# Altium footprint library 7-Connectors-12.PcbLib: 76 footprints (part 1 of 5)
Each footprint in its own frame and in the unit in brackets; x right, y up, seen from the top. Pads: shape width x height; smd on the part's side, far side on the other; paste and mask are expansions set on the pad; w line width, h text height; cw(c..) or ccw(c..) is an arc to the next point about the centre after c.
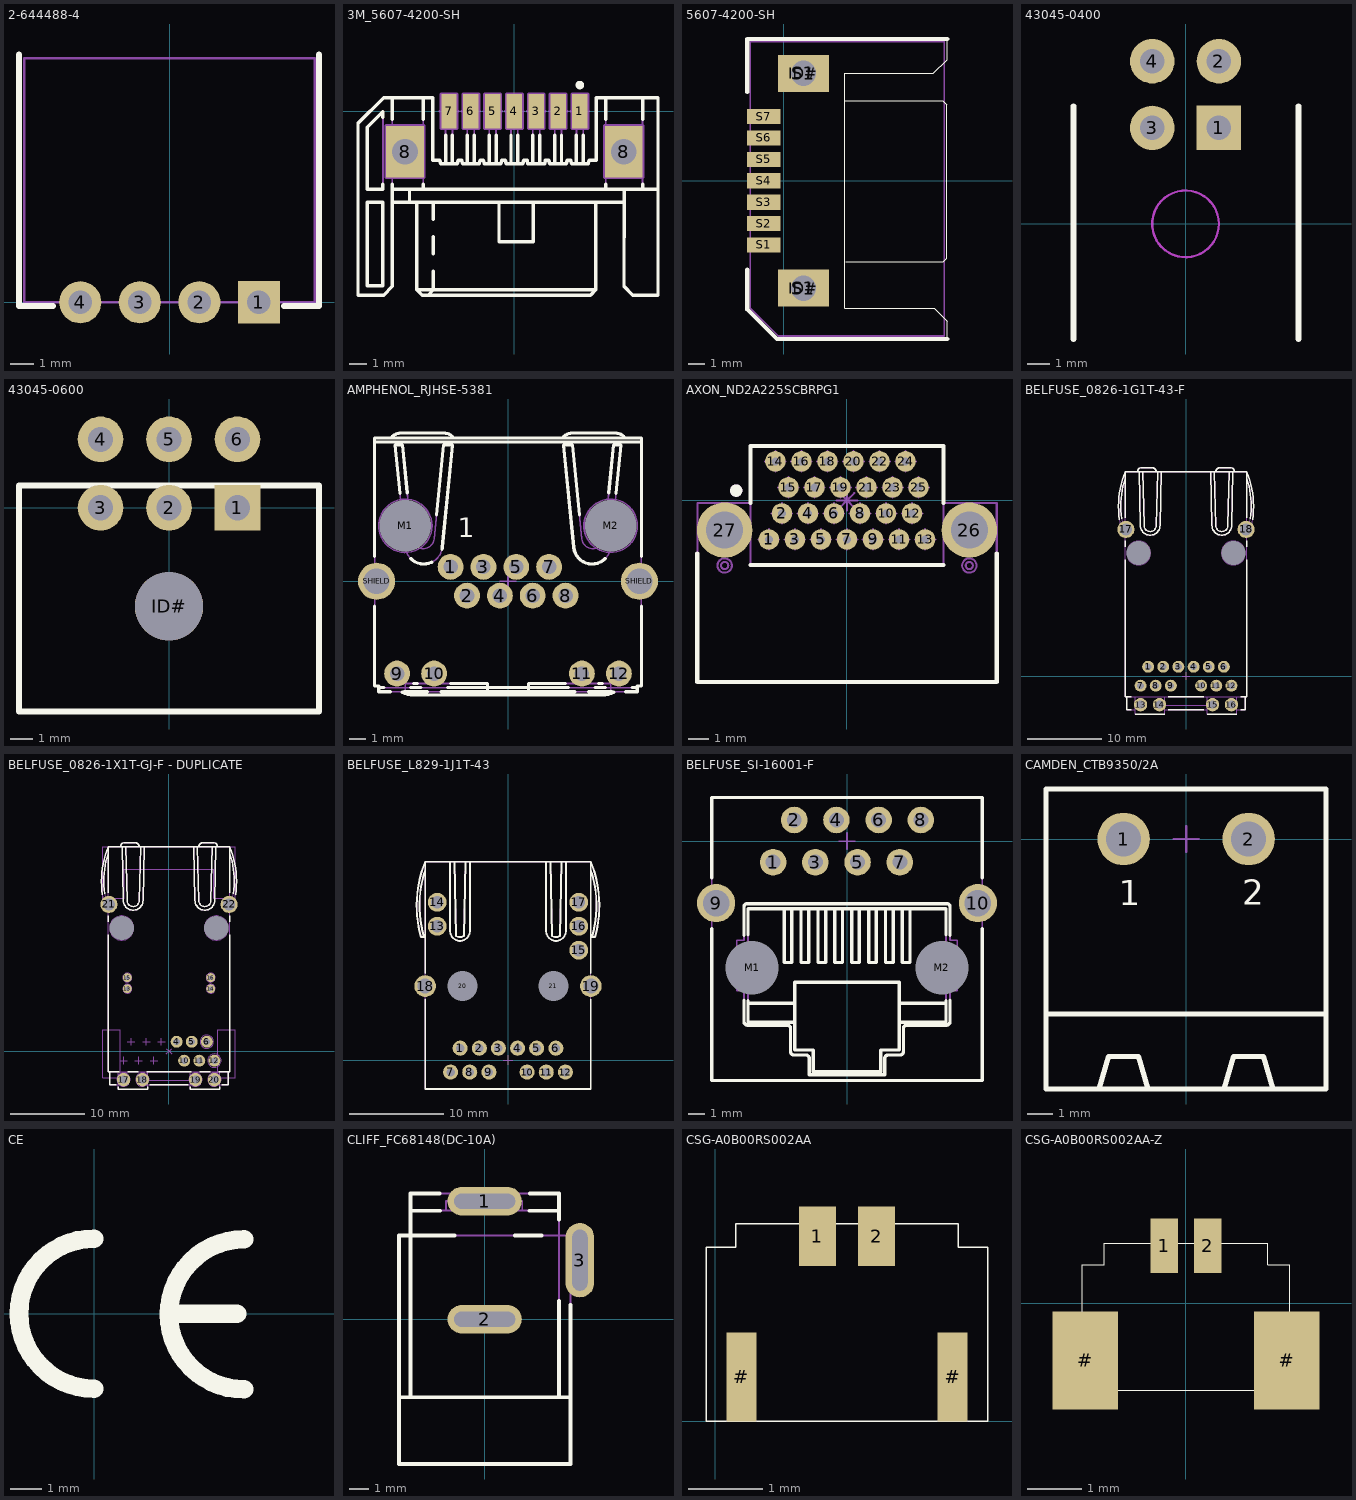
[diagram p0: the footprints below, top view; thin cyan lines are the x and y axes]

## 2-644488-4 [mm] "797-3097 // TE Connectivity"
height 26
pads (4):
  rect 1.8x1.8 hole 1 mask+0.07: 1(3.81,0)
  round 1.8 hole 1 mask+0.07: 2(1.27,0) 3(-1.27,0)
  round 1.8 hole 1: 4(-3.81,0)
Top Overlay:
  lines w0.254: -6.426,10.566 -6.426,-0.165 -4.978,-0.165 ; 4.889,-0.152 6.375,-0.152 6.375,10.566
Mechanical 15:
  lines w0.1: -6.2,0 -6.2,10.414 6.2,10.414 6.2,0 -6.2,0
3D body "mta-100_2_54.stp": height 8, standoff -2, extent -6.188,-0.266 6.162,10.541
3D body "2-2_1_5.stp": height 0.1, standoff -2.1, extent -4.81,-1 -2.81,1
3D body "2-2_1_5.stp": height 0.1, standoff -2.1, extent -2.27,-1 -0.27,1
3D body "2-2_1_5.stp": height 0.1, standoff -2.1, extent 0.27,-1 2.27,1
3D body "2-2_1_5.stp": height 0.1, standoff -2.1, extent 2.81,-1 4.81,1

## 3M_5607-4200-SH [mm] "1.27mm (.050\") Pitch, Surface Mount, Right Angle, Serial ATA Plug (SATA)"
height 4
pads (9):
  rect 0.9x2 smd: 1(3.81,0) 2(2.54,0) 3(1.27,0) 4(0,0) 5(-1.27,0) 6(-2.54,0) 7(-3.81,0)
  rect 2.2x3 hole 1.5: 8(-6.37,-2.36) 8(6.37,-2.36)
Top Overlay:
  circle w0.25: c3.81,1.516 r0.125
  lines w0.2: -7.66,-4.25 -7.66,-4.559 -8.56,-4.559 -8.56,-0.937 -7.66,-0.037 -7.66,-0.346 ; -7.11,-5.309 6.38,-5.309 ; -7.11,-4.559 8.36,-4.559 ; -7.11,-4.26 -7.11,-10.209 -7.61,-10.709 -9.11,-10.709 -9.11,-0.709 -7.61,0.791 -4.76,0.791 -4.76,-2.859 -4.345,-2.859 -4.296,-3.059 -3.324,-3.059 -3.275,-2.859 -3.075,-2.859 -3.026,-3.059 -2.054,-3.059 -2.005,-2.859 -1.805,-2.859 -1.756,-3.059 -0.784,-3.059 -0.735,-2.859 -0.535,-2.859 -0.486,-3.059 0.486,-3.059 0.535,-2.859 0.735,-2.859 0.784,-3.059 1.756,-3.059 1.805,-2.859 2.005,-2.859 2.054,-3.059 3.026,-3.059 3.075,-2.859 3.275,-2.859 3.324,-3.059 4.296,-3.059 4.345,-2.859 4.76,-2.859 4.76,0.791 8.36,0.791 8.36,-10.709 6.88,-10.709 6.38,-10.209 6.382,-4.569 ; -7.11,-0.46 -7.11,0.791 ; -6.11,-5.309 -6.11,-4.559 ; -5.68,-5.309 -5.68,-10.409 ; -5.31,-4.559 -5.31,-4.26 ; -5.31,-0.46 -5.31,0.791 ; -5.019,-10.709 -4.719,-10.409 -4.719,-9.309 ; -4.719,-8.309 -4.719,-7.309 ; -4.719,-6.309 -4.719,-5.309 ; -4.01,-3.059 -4.01,-1.4 ; -3.61,-3.059 -3.61,-1.4 ; -2.74,-3.059 -2.74,-1.4 ; -2.34,-3.059 -2.34,-1.4 ; -1.47,-3.059 -1.47,-1.4 ; -1.07,-3.059 -1.07,-1.4 ; -0.9,-5.309 -0.9,-7.609 1.1,-7.609 1.1,-5.309 ; -0.2,-3.059 -0.2,-1.4 ; 0.2,-3.059 0.2,-1.4 ; 1.07,-3.059 1.07,-1.4 ; 1.47,-3.059 1.47,-1.4 ; 2.34,-3.059 2.34,-1.4 ; 2.74,-3.059 2.74,-1.4 ; 3.61,-3.059 3.61,-1.4 ; 4.01,-3.059 4.01,-1.4 ; 4.73,-5.309 4.73,-10.409 ; 5.31,-4.559 5.31,-4.26 ; 5.31,-0.46 5.31,0.791 ; 7.46,-4.559 7.46,-4.26 ; 7.46,-0.46 7.46,0.791 ; -5.68,-10.409 -5.38,-10.709 4.43,-10.709 4.73,-10.409 ; -5.68,-10.409 4.73,-10.409 ; -8.56,-10.159 -7.66,-10.159 -7.66,-5.309 -8.56,-5.309 -8.56,-10.159
Mechanical 8:
  circle w0.1: c-6.37,-2.36 r0.75
  circle w0.1: c6.37,-2.36 r0.75
  lines w0.2: -6.87,-2.36 -6.37,-2.36 ; -6.37,-2.86 -6.37,-2.36 ; -6.37,-1.86 -6.37,-2.36 ; -5.87,-2.36 -6.37,-2.36 ; -4.31,0 -3.81,0 ; -3.81,-0.5 -3.81,0 ; -3.81,0.5 -3.81,0 ; -3.31,0 -3.81,0 ; -3.04,0 -2.54,0 ; -2.54,-0.5 -2.54,0 ; -2.54,0.5 -2.54,0 ; -2.04,0 -2.54,0 ; -1.77,0 -1.27,0 ; -1.27,-0.5 -1.27,0 ; -1.27,0.5 -1.27,0 ; -0.77,0 -1.27,0 ; -0.5,0 0,0 ; 0,-0.5 0,0 ; 0,0.5 0,0 ; 0.5,0 0,0 ; 0.77,0 1.27,0 ; 1.27,-0.5 1.27,0 ; 1.27,0.5 1.27,0 ; 1.77,0 1.27,0 ; 2.04,0 2.54,0 ; 2.54,-0.5 2.54,0 ; 2.54,0.5 2.54,0 ; 3.04,0 2.54,0 ; 3.31,0 3.81,0 ; 3.81,-0.5 3.81,0 ; 3.81,0.5 3.81,0 ; 4.31,0 3.81,0 ; 5.87,-2.36 6.37,-2.36 ; 6.37,-2.86 6.37,-2.36 ; 6.37,-1.86 6.37,-2.36 ; 6.87,-2.36 6.37,-2.36 ; -7.47,-3.86 -7.47,-0.86 -5.27,-0.86 -5.27,-3.86 -7.47,-3.86 ; -4.26,-1 -4.26,1 -3.36,1 -3.36,-1 -4.26,-1 ; -2.99,-1 -2.99,1 -2.09,1 -2.09,-1 -2.99,-1 ; -1.72,-1 -1.72,1 -0.82,1 -0.82,-1 -1.72,-1 ; -0.45,-1 -0.45,1 0.45,1 0.45,-1 -0.45,-1 ; 0.82,-1 0.82,1 1.72,1 1.72,-1 0.82,-1 ; 2.09,-1 2.09,1 2.99,1 2.99,-1 2.09,-1 ; 3.36,-1 3.36,1 4.26,1 4.26,-1 3.36,-1 ; 5.27,-3.86 5.27,-0.86 7.47,-0.86 7.47,-3.86 5.27,-3.86
Mechanical 14:
  lines w0.1: -7.11,-5.309 6.38,-5.309 ; -7.11,-4.559 8.36,-4.559 ; -7.11,0.791 -7.11,-10.209 -7.61,-10.709 -9.11,-10.709 -9.11,-0.709 -7.61,0.791 -4.76,0.791 -4.76,-2.859 -4.345,-2.859 -4.296,-3.059 -3.324,-3.059 -3.275,-2.859 -3.075,-2.859 -3.026,-3.059 -2.054,-3.059 -2.005,-2.859 -1.805,-2.859 -1.756,-3.059 -0.784,-3.059 -0.735,-2.859 -0.535,-2.859 -0.486,-3.059 0.486,-3.059 0.535,-2.859 0.735,-2.859 0.784,-3.059 1.756,-3.059 1.805,-2.859 2.005,-2.859 2.054,-3.059 3.026,-3.059 3.075,-2.859 3.275,-2.859 3.324,-3.059 4.296,-3.059 4.345,-2.859 4.76,-2.859 4.76,0.791 8.36,0.791 8.36,-10.709 6.88,-10.709 6.38,-10.209 6.382,-4.569 ; -6.11,-5.309 -6.11,-4.559 ; -5.68,-5.309 -5.68,-10.409 ; -5.31,-4.559 -5.31,0.791 ; -5.019,-10.709 -4.719,-10.409 -4.719,-9.309 ; -4.719,-8.309 -4.719,-7.309 ; -4.719,-6.309 -4.719,-5.309 ; -4.01,-3.059 -4.01,0.591 -3.61,0.591 -3.61,-3.059 ; -2.74,-3.059 -2.74,0.591 -2.34,0.591 -2.34,-3.059 ; -1.47,-3.059 -1.47,0.591 -1.07,0.591 -1.07,-3.059 ; -0.9,-5.309 -0.9,-7.609 1.1,-7.609 1.1,-5.309 ; -0.2,-3.059 -0.2,0.591 0.2,0.591 0.2,-3.059 ; 1.07,-3.059 1.07,0.591 1.47,0.591 1.47,-3.059 ; 2.34,-3.059 2.34,0.591 2.74,0.591 2.74,-3.059 ; 3.61,-3.059 3.61,0.591 4.01,0.591 4.01,-3.059 ; 4.73,-5.309 4.73,-10.409 ; 5.31,-4.559 5.31,0.791 ; 7.46,-4.559 7.46,0.791 ; -5.68,-10.409 -5.38,-10.709 4.43,-10.709 4.73,-10.409 ; -5.68,-10.409 4.73,-10.409 ; -8.56,-10.159 -7.66,-10.159 -7.66,-5.309 -8.56,-5.309 -8.56,-10.159 ; -8.56,-4.559 -7.66,-4.559 -7.66,-0.037 -8.56,-0.937 -8.56,-4.559 ; -6.52,-3.535 -6.22,-3.535 -6.22,-1.177 -6.52,-1.177 -6.52,-3.535 ; 6.22,-3.535 6.52,-3.535 6.52,-1.177 6.22,-1.177 6.22,-3.535
3D body "3M_5607-4200-SH.stp": height 4, standoff -2.7, extent -9.11,-10.709 8.36,0.791

## 5607-4200-SH [mm] "828-2055 // 3M"
height 6.72
pads (11):
  round 2.2 hole 1.5: ID#(1.18,-6.37)
  round 2.2 hole 1.5 mask+0.07: ID#(1.18,6.37)
  rect 2x0.9 smd mask+0.07: S1(-1.18,-3.81) S2(-1.18,-2.54) S3(-1.18,-1.27) S4(-1.18,0) S5(-1.18,1.27) S6(-1.18,2.54) S7(-1.18,3.81)
  rect 3x2.2 smd mask+0.07: S1(1.18,-6.37) S1(1.18,6.37)
Top Overlay:
  lines w0.03: 3.658,4.75 9.449,4.75 9.677,4.521 9.677,-4.597 9.474,-4.801 3.683,-4.801 ; 9.703,-9.385 9.703,-8.331 8.941,-7.569 3.632,-7.569 3.632,6.363 8.89,6.363 9.703,7.175 9.703,8.407
  lines w0.254: -2.146,-5.271 -2.146,-7.633 -0.394,-9.385 9.703,-9.385 ; -2.146,5.258 -2.146,8.407 9.703,8.407
Mechanical 15:
  lines w0.1: -1.969,-7.556 -0.318,-9.207 9.525,-9.207 9.525,8.255 -1.969,8.255 -1.969,-7.556
3D body "3m5561_sata.stp": height 4, standoff -2.7, extent -1.991,-8.735 9.509,8.735
3D body "0_9-2.stp": height 0.02, standoff 0, extent -2.18,3.36 -0.18,4.26
3D body "0_9-2.stp": height 0.02, standoff 0, extent -2.18,2.09 -0.18,2.99
3D body "0_9-2.stp": height 0.02, standoff 0, extent -2.18,0.82 -0.18,1.72
3D body "0_9-2.stp": height 0.02, standoff 0, extent -2.18,-0.45 -0.18,0.45
3D body "0_9-2.stp": height 0.02, standoff 0, extent -2.18,-1.72 -0.18,-0.82
3D body "0_9-2.stp": height 0.02, standoff 0, extent -2.18,-2.99 -0.18,-2.09
3D body "0_9-2.stp": height 0.02, standoff 0, extent -2.18,-4.26 -0.18,-3.36

## 43045-0400 [mm] "233-2955 // Molex"
height 9.6
pads (4):
  rect 2x2 hole 1.1 mask+0.07: 1(1.5,4.318)
  round 2 hole 1.1 mask+0.07: 2(1.5,7.318) 3(-1.5,4.318)
  round 2 hole 1.1: 4(-1.5,7.318)
Top Overlay:
  lines w0.254: -5.042,-5.182 -5.042,5.298 ; 5.08,-5.182 5.08,5.298
Keep-Out Layer:
  circle w0.1: c0,-0.002 r1.5
Mechanical 1:
  circle w0.1: c0,-0.002 r1.5
3D body "43045-0400.stp": height 8.67, standoff -3.18, extent -4.825,-4.98 4.825,7.55
3D body "2-2_1_5.stp": height 0.1, standoff -2.1, extent -2.5,6.318 -0.5,8.318
3D body "2-2_1_5.stp": height 0.1, standoff -2.1, extent 0.5,6.318 2.5,8.318
3D body "2-2_1_5.stp": height 0.1, standoff -2.1, extent 0.5,3.318 2.5,5.318
3D body "2-2_1_5.stp": height 0.1, standoff -2.1, extent -2.5,3.318 -0.5,5.318

## 43045-0600 [mm] "Molex"
height 7.37
pads (7):
  rect 2x2 hole 1.1: 1(3,0)
  round 2 hole 1.1 mask+0.07: 2(0,0) 3(-3,0) 4(-3,3) 5(0,3) 6(3,3)
  round 3 hole 3 mask+0.07: ID#(0,-4.32)
Top Overlay:
  lines w0.254: -6.575,-8.93 6.575,-8.93 6.575,0.98 -6.575,0.98 -6.575,-8.93
3D body "43045-0400.stp": height 8.67, standoff -3.18, extent -4.8,-9.121 4.85,3.409

## AMPHENOL_RJHSE-5381 [mm] "1 Port, 8 Positions, CAT5 RJ45 Modular Connector With Yellow And Green LEDs"
height 13.46
pads (16):
  round 1.6 hole 0.9: 1(-3.554,0.886) 2(-2.538,-0.894) 3(-1.522,0.886) 4(-0.506,-0.894) 5(0.51,0.886) 6(1.526,-0.894) 7(2.542,0.886) 8(3.558,-0.894) 9(-6.862,-5.714) 10(-4.572,-5.714) 11(4.568,-5.714) 12(6.858,-5.714)
  round 1 hole 3.2 unplated mask+1.1: M1(-6.352,3.426) M2(6.348,3.426)
  round 2.3 hole 1.6: SHIELD(-8.132,-0.004) SHIELD(8.128,-0.004)
Top Overlay:
  lines w0.2: -8.257,-1.549 -8.257,-6.478 -8.003,-6.478 -8.003,-6.834 -7.293,-6.834 ; -8.257,1.541 -8.257,8.863 8.253,8.863 8.253,1.541 ; -8.257,8.609 8.253,8.609 ; -8.003,-6.58 -7.693,-6.58 ; -7.242,8.863 cw(c-6.621,8.379) -6.621,9.166 -3.979,9.166 cw(c-3.979,8.379) -3.358,8.863 ; -6.688,5.449 -6.987,8.432 -6.53,8.432 -6.233,5.473 ; -6.54,-6.87 ccw(c-5.844,-5.507) -5.844,-7.037 5.84,-7.037 ccw(c5.84,-5.507) 6.536,-6.87 ; -6.431,-6.834 -5.003,-6.834 ; -6.031,-6.58 -5.403,-6.58 ; -6.022,1.403 ccw(c-5.209,2.214) -4.719,1.176 ; -5.83,-6.326 -5.604,-6.326 ; -4.422,4.118 -3.99,8.432 -3.431,8.432 -4.066,2.1 cw(c-5.209,2.214) -4.089,1.961 ; -4.141,-6.834 4.137,-6.834 ; -3.741,-6.58 3.737,-6.58 ; -3.54,-6.326 -1.272,-6.326 -1.272,-6.834 ; 1.268,-6.834 1.268,-6.326 3.536,-6.326 ; 3.366,8.863 cw(c3.986,8.379) 3.986,9.166 6.628,9.166 cw(c6.628,8.379) 7.249,8.863 ; 4.418,4.118 3.986,8.432 3.427,8.432 4.062,2.1 ccw(c5.205,2.214) 6.018,1.403 ; 4.999,-6.834 6.427,-6.834 ; 5.399,-6.58 6.027,-6.58 ; 5.6,-6.326 5.826,-6.326 ; 6.229,5.473 6.526,8.432 6.983,8.432 6.684,5.449 ; 7.289,-6.834 7.999,-6.834 7.999,-6.478 8.253,-6.478 8.253,-1.549 ; 7.689,-6.58 7.999,-6.58
  text "1" at -3.12,2.725 h1.2
Mechanical 8:
  circle w0.1: c6.348,3.426 r1.65
  circle w0.1: c-6.352,3.426 r1.65
  circle w0.1: c8.128,-0.004 r0.8
  circle w0.1: c-8.132,-0.004 r0.8
  circle w0.1: c3.558,-0.894 r0.45
  circle w0.1: c1.526,-0.894 r0.45
  circle w0.1: c-0.506,-0.894 r0.45
  circle w0.1: c-2.538,-0.894 r0.45
  circle w0.1: c-3.554,0.886 r0.45
  circle w0.1: c-1.522,0.886 r0.45
  circle w0.1: c0.51,0.886 r0.45
  circle w0.1: c2.542,0.886 r0.45
  lines w0.1: -8.632,-0.004 -8.132,-0.004 ; -8.132,-0.504 -8.132,-0.004 ; -8.132,0.496 -8.132,-0.004 ; -7.632,-0.004 -8.132,-0.004 ; -7.362,-5.714 -6.862,-5.714 ; -6.862,-6.214 -6.862,-5.714 ; -6.862,-5.214 -6.862,-5.714 ; -6.852,3.426 -6.352,3.426 ; -6.362,-5.714 -6.862,-5.714 ; -6.352,2.926 -6.352,3.426 ; -6.352,3.926 -6.352,3.426 ; -5.852,3.426 -6.352,3.426 ; -5.072,-5.714 -4.572,-5.714 ; -4.572,-6.214 -4.572,-5.714 ; -4.572,-5.214 -4.572,-5.714 ; -4.072,-5.714 -4.572,-5.714 ; -4.054,0.886 -3.554,0.886 ; -3.554,0.386 -3.554,0.886 ; -3.554,1.386 -3.554,0.886 ; -3.054,0.886 -3.554,0.886 ; -3.038,-0.894 -2.538,-0.894 ; -2.538,-1.394 -2.538,-0.894 ; -2.538,-0.394 -2.538,-0.894 ; -2.038,-0.894 -2.538,-0.894 ; -2.022,0.886 -1.522,0.886 ; -1.522,0.386 -1.522,0.886 ; -1.522,1.386 -1.522,0.886 ; -1.022,0.886 -1.522,0.886 ; -1.006,-0.894 -0.506,-0.894 ; -0.506,-1.394 -0.506,-0.894 ; -0.506,-0.394 -0.506,-0.894 ; -0.5,0 0,0 ; -0.006,-0.894 -0.506,-0.894 ; 0,-0.5 0,0 ; 0,0.5 0,0 ; 0.01,0.886 0.51,0.886 ; 0.5,0 0,0 ; 0.51,0.386 0.51,0.886 ; 0.51,1.386 0.51,0.886 ; 1.01,0.886 0.51,0.886 ; 1.026,-0.894 1.526,-0.894 ; 1.526,-1.394 1.526,-0.894 ; 1.526,-0.394 1.526,-0.894 ; 2.026,-0.894 1.526,-0.894 ; 2.042,0.886 2.542,0.886 ; 2.542,0.386 2.542,0.886 ; 2.542,1.386 2.542,0.886 ; 3.042,0.886 2.542,0.886 ; 3.058,-0.894 3.558,-0.894 ; 3.558,-1.394 3.558,-0.894 ; 3.558,-0.394 3.558,-0.894 ; 4.058,-0.894 3.558,-0.894 ; 4.068,-5.714 4.568,-5.714 ; 4.568,-6.214 4.568,-5.714 ; 4.568,-5.214 4.568,-5.714 ; 5.068,-5.714 4.568,-5.714 ; 5.848,3.426 6.348,3.426 ; 6.348,2.926 6.348,3.426 ; 6.348,3.926 6.348,3.426 ; 6.358,-5.714 6.858,-5.714 ; 6.848,3.426 6.348,3.426 ; 6.858,-6.214 6.858,-5.714 ; 6.858,-5.214 6.858,-5.714 ; 7.358,-5.714 6.858,-5.714 ; 7.628,-0.004 8.128,-0.004 ; 8.128,-0.504 8.128,-0.004 ; 8.128,0.496 8.128,-0.004 ; 8.628,-0.004 8.128,-0.004
Mechanical 14:
  lines w0.1: -8.257,-0.408 cw(c-7.884,-0.027) -8.257,0.354 ; -8.257,8.609 8.253,8.609 ; -8.003,-6.58 7.999,-6.58 ; -7.242,8.863 cw(c-6.621,8.379) -6.621,9.166 -3.979,9.166 cw(c-3.979,8.379) -3.358,8.863 ; -6.606,-6.834 ccw(c-5.844,-5.507) -5.844,-7.037 5.84,-7.037 ccw(c5.84,-5.507) 6.602,-6.834 ; -6.352,-6.834 -6.352,-6.326 -1.272,-6.326 -1.272,-6.834 ; 1.268,-6.834 1.268,-6.326 6.348,-6.326 6.348,-6.834 ; 3.366,8.863 cw(c3.986,8.379) 3.986,9.166 6.628,9.166 cw(c6.628,8.379) 7.249,8.863 ; 8.253,-0.408 ccw(c7.88,-0.027) 8.253,0.354 ; -8.257,-6.478 -8.003,-6.478 -8.003,-6.834 7.999,-6.834 7.999,-6.478 8.253,-6.478 8.253,8.863 -8.257,8.863 -8.257,-6.478 ; -6.987,8.432 -6.352,2.1 ccw(c-5.209,2.214) -4.066,2.1 -3.431,8.432 -3.99,8.432 -4.572,2.63 cw(c-5.26,2.697) -5.948,2.63 -6.53,8.432 -6.987,8.432 ; 3.427,8.432 4.062,2.1 ccw(c5.205,2.214) 6.348,2.1 6.983,8.432 6.526,8.432 5.944,2.63 cw(c5.256,2.697) 4.568,2.63 3.986,8.432 3.427,8.432
  text "1" at -3.12,2.725 h1.2
3D body "AMPHENOL_RJHSE-5381.stp": height 15.14, standoff -3.7, extent -8.417,-7.037 8.413,9.166

## AXON_ND2A225SCBRPG1 [mm] "AXON Nano-D 2 Row Right Angle PCB Receptacle With Threaded Hole #0-80 UNF"
height 3.82
pads (27):
  round 1 hole 0.4: 1(-3.81,-1.905) 2(-3.175,-0.635) 3(-2.54,-1.905) 4(-1.905,-0.635) 5(-1.27,-1.905) 6(-0.635,-0.635) 7(0,-1.905) 8(0.635,-0.635) 9(1.27,-1.905) 10(1.905,-0.635) 11(2.54,-1.905) 12(3.175,-0.635) 13(3.81,-1.905) 14(-3.493,1.905) 15(-2.858,0.635) 16(-2.222,1.905) 17(-1.587,0.635) 18(-0.953,1.905) 19(-0.318,0.635) 20(0.318,1.905) 21(0.953,0.635) 22(1.587,1.905) 23(2.222,0.635) 24(2.858,1.905) 25(3.493,0.635)
  round 2.7 hole 1.8: 26(5.969,-1.448) 27(-5.968,-1.448)
Top Overlay:
  circle w0.3: c-5.408,0.478 r0.15
  lines w0.2: -7.304,-2.6 -7.304,-8.868 7.306,-8.868 7.306,-2.6 ; -4.704,-3.148 4.701,-3.148 ; -4.699,-0.128 -4.699,2.662 ; 4.701,-0.128 4.701,2.662 ; -4.699,2.662 4.701,2.662 ; -4.699,2.662 4.701,2.662
Mechanical 8:
  circle w0.1: c5.969,-1.448 r0.9
  circle w0.1: c-5.968,-1.448 r0.9
  lines w0.1: -6.468,-1.448 -5.968,-1.448 ; -5.968,-1.948 -5.968,-1.448 ; -5.968,-0.948 -5.968,-1.448 ; -5.468,-1.448 -5.968,-1.448 ; -4.31,-1.905 -3.81,-1.905 ; -3.993,1.905 -3.493,1.905 ; -3.81,-2.405 -3.81,-1.905 ; -3.81,-1.405 -3.81,-1.905 ; -3.675,-0.635 -3.175,-0.635 ; -3.493,1.405 -3.493,1.905 ; -3.493,2.405 -3.493,1.905 ; -3.358,0.635 -2.858,0.635 ; -3.31,-1.905 -3.81,-1.905 ; -3.175,-1.135 -3.175,-0.635 ; -3.175,-0.135 -3.175,-0.635 ; -3.04,-1.905 -2.54,-1.905 ; -2.993,1.905 -3.493,1.905 ; -2.858,0.135 -2.858,0.635 ; -2.858,1.135 -2.858,0.635 ; -2.723,1.905 -2.222,1.905 ; -2.675,-0.635 -3.175,-0.635 ; -2.54,-2.405 -2.54,-1.905 ; -2.54,-1.405 -2.54,-1.905 ; -2.405,-0.635 -1.905,-0.635 ; -2.358,0.635 -2.858,0.635 ; -2.222,1.405 -2.222,1.905 ; -2.222,2.405 -2.222,1.905 ; -2.088,0.635 -1.587,0.635 ; -2.04,-1.905 -2.54,-1.905 ; -1.905,-1.135 -1.905,-0.635 ; -1.905,-0.135 -1.905,-0.635 ; -1.77,-1.905 -1.27,-1.905 ; -1.723,1.905 -2.222,1.905 ; -1.587,0.135 -1.587,0.635 ; -1.587,1.135 -1.587,0.635 ; -1.453,1.905 -0.953,1.905 ; -1.405,-0.635 -1.905,-0.635 ; -1.27,-2.405 -1.27,-1.905 ; -1.27,-1.405 -1.27,-1.905 ; -1.135,-0.635 -0.635,-0.635 ; -1.088,0.635 -1.587,0.635 ; -0.953,1.405 -0.953,1.905 ; -0.953,2.405 -0.953,1.905 ; -0.818,0.635 -0.318,0.635 ; -0.77,-1.905 -1.27,-1.905 ; -0.635,-1.135 -0.635,-0.635 ; -0.635,-0.135 -0.635,-0.635 ; -0.5,-1.905 0,-1.905 ; -0.5,0 0,0 ; -0.453,1.905 -0.953,1.905 ; -0.354,-0.354 0,0 ; -0.354,0.354 0,0 ; -0.318,0.135 -0.318,0.635 ; -0.318,1.135 -0.318,0.635 ; -0.183,1.905 0.318,1.905 ; -0.135,-0.635 -0.635,-0.635 ; 0,-2.405 0,-1.905 ; 0,-1.405 0,-1.905 ; 0,-0.5 0,0 ; 0,0.5 0,0 ; 0.135,-0.635 0.635,-0.635 ; 0.182,0.635 -0.318,0.635 ; 0.318,1.405 0.318,1.905 ; 0.318,2.405 0.318,1.905 ; 0.354,-0.354 0,0 ; 0.354,0.354 0,0 ; 0.453,0.635 0.953,0.635 ; 0.5,-1.905 0,-1.905 ; 0.5,0 0,0 ; 0.635,-1.135 0.635,-0.635 ; 0.635,-0.135 0.635,-0.635 ; 0.77,-1.905 1.27,-1.905 ; 0.818,1.905 0.318,1.905 ; 0.953,0.135 0.953,0.635 ; 0.953,1.135 0.953,0.635 ; 1.088,1.905 1.587,1.905 ; 1.135,-0.635 0.635,-0.635 ; 1.27,-2.405 1.27,-1.905 ; 1.27,-1.405 1.27,-1.905 ; 1.405,-0.635 1.905,-0.635 ; 1.453,0.635 0.953,0.635 ; 1.587,1.405 1.587,1.905 ; 1.587,2.405 1.587,1.905 ; 1.723,0.635 2.222,0.635 ; 1.77,-1.905 1.27,-1.905 ; 1.905,-1.135 1.905,-0.635 ; 1.905,-0.135 1.905,-0.635 ; 2.04,-1.905 2.54,-1.905 ; 2.088,1.905 1.587,1.905 ; 2.222,0.135 2.222,0.635 ; 2.222,1.135 2.222,0.635 ; 2.358,1.905 2.858,1.905 ; 2.405,-0.635 1.905,-0.635 ; 2.54,-2.405 2.54,-1.905 ; 2.54,-1.405 2.54,-1.905 ; 2.675,-0.635 3.175,-0.635 ; 2.723,0.635 2.222,0.635 ; 2.858,1.405 2.858,1.905 ; 2.858,2.405 2.858,1.905 ; 2.993,0.635 3.493,0.635 ; 3.04,-1.905 2.54,-1.905 ; 3.175,-1.135 3.175,-0.635 ; 3.175,-0.135 3.175,-0.635 ; 3.31,-1.905 3.81,-1.905 ; 3.358,1.905 2.858,1.905 ; 3.493,0.135 3.493,0.635 ; 3.493,1.135 3.493,0.635 ; 3.675,-0.635 3.175,-0.635 ; 3.81,-2.405 3.81,-1.905 ; 3.81,-1.405 3.81,-1.905 ; 3.993,0.635 3.493,0.635 ; 4.31,-1.905 3.81,-1.905 ; 5.469,-1.448 5.969,-1.448 ; 5.969,-1.948 5.969,-1.448 ; 5.969,-0.948 5.969,-1.448 ; 6.469,-1.448 5.969,-1.448
Mechanical 14:
  circle w0.1: c5.969,-3.178 r0.175
  circle w0.1: c5.969,-3.178 r0.35
  circle w0.1: c-5.968,-3.178 r0.175
  circle w0.1: c-5.968,-3.178 r0.35
  circle w0.1: c-5.968,-1.448 r0.596
  circle w0.1: c5.969,-1.448 r0.596
  circle w0.3: c-5.408,0.478 r0.15
  lines w0.1: -4.699,-3.148 -4.699,2.662 ; -4.699,-0.128 -7.304,-0.128 -7.304,-8.868 7.306,-8.868 7.306,-0.128 4.701,-0.128 ; 4.706,-3.148 4.701,2.662 ; -4.699,2.662 4.701,2.662 ; -4.699,2.662 -4.704,-3.148 4.701,-3.148 4.701,2.662 ; -4.699,2.662 4.701,2.662
3D body "AXON_ND2A225SCBRPG1.stp": height 3.56, standoff -2.77, extent -7.304,-8.868 7.306,2.662
